# Altium schematic symbol library Analog Devices Operational Amplifiers.SchLib: 2102 symbols (part 4 of 35) (continued)
## AD824AR-14-REEL7
designator U?
Quad Channel Rail-to-Rail Operational Amplifier, 2 MHz BW, 2 V/us SR, Industrial, 14-pin SOIC (R-14), Reel; Generic Part Number: AD824; Manufacturer: Analog Devices; PartNumber: AD824AR-14-REEL7; Amplifiers Per Package: 4; Input Bias Current: 4pA; Input Offset Voltage: 500uV; Iq/Amp: 625uA; Slew Rate: 2V/us; Small Signal Bandwidth: 2MHz; V Span Max: 36V; V Span Min: 3V; DatasheetVersion: Rev. C; PackageVersion: 060606-A; PackageReference: R-14; PackageDescription: 14-Pin Standard Small Outline Package, Body 8.65 x 3.9 mm, Pitch 1.27 mm; Supplier 1: Digi-Key; Supplier Part Number 1: AD824AR-14-REEL7-ND; Supplier 2: Newark; Supplier Part Number 2: 88H0201; Mounting Technology: Surface Mount; Code_JEDEC: MS-012-AB; ComponentLink1Description: Manufacturer URL; ComponentLink1URL: http://www.analog.com/en/index.html; ComponentLink2Description: Datasheet; ComponentLink2URL: http://www.analog.com/static/imported-files/data_sheets/AD824.pdf; ComponentLink3Description: Package Specification; ComponentLink3URL: http://www.analog.com/static/imported-files/packages/PKG_PDF/SOIC_Narrow%20(R)/R_14.pdf
footprint ADI-R-14_N (SOIC, 14-Leads, Body 8.65x3.9mm, Pitch 1.27mm, IPC Medium Density)
footprint ADI-R-14_L (SOIC, 14-Leads, Body 8.65x3.9mm, Pitch 1.27mm, IPC High Density)
footprint ADI-R-14_M (SOIC, 14-Leads, Body 8.65x3.9mm, Pitch 1.27mm, IPC Low Density)
pins on every part: 4 +V (power), 11 -V (power)
part A pins: 1 OUT A (out), 2 -IN A (in), 3 +IN A (in)
part B pins: 5 +IN B (in), 6 -IN B (in), 7 OUT B (out)
part C pins: 8 OUT C (out), 9 -IN C (in), 10 +IN C (in)
part D pins: 12 +IN D (in), 13 -IN D (in), 14 OUT D (out)

## AD824ARZ-14
designator U?
Quad Channel Rail-to-Rail Operational Amplifier, 2 MHz BW, 2 V/us SR, Industrial, 14-pin SOIC (R-14), Tube; Generic Part Number: AD824; Manufacturer: Analog Devices; PartNumber: AD824ARZ-14; Amplifiers Per Package: 4; Input Bias Current: 4pA; Input Offset Voltage: 500uV; Iq/Amp: 625uA; Slew Rate: 2V/us; Small Signal Bandwidth: 2MHz; V Span Max: 36V; V Span Min: 3V; DatasheetVersion: Rev. C; PackageVersion: 060606-A; PackageReference: R-14; PackageDescription: 14-Pin Standard Small Outline Package, Body 8.65 x 3.9 mm, Pitch 1.27 mm; Supplier 1: Digi-Key; Supplier Part Number 1: AD824ARZ-14-ND; Supplier 2: Farnell; Supplier Part Number 2: 9425535; Supplier 3: Newark; Supplier Part Number 3: 88H0202; Mounting Technology: Surface Mount; Code_JEDEC: MS-012-AB; ComponentLink1Description: Manufacturer URL; ComponentLink1URL: http://www.analog.com/en/index.html; ComponentLink2Description: Datasheet; ComponentLink2URL: http://www.analog.com/static/imported-files/data_sheets/AD824.pdf; ComponentLink3Description: Package Specification; ComponentLink3URL: http://www.analog.com/static/imported-files/packages/PKG_PDF/SOIC_Narrow%20(R)/R_14.pdf
footprint ADI-R-14_N (SOIC, 14-Leads, Body 8.65x3.9mm, Pitch 1.27mm, IPC Medium Density)
footprint ADI-R-14_L (SOIC, 14-Leads, Body 8.65x3.9mm, Pitch 1.27mm, IPC High Density)
footprint ADI-R-14_M (SOIC, 14-Leads, Body 8.65x3.9mm, Pitch 1.27mm, IPC Low Density)
pins on every part: 4 +V (power), 11 -V (power)
part A pins: 1 OUT A (out), 2 -IN A (in), 3 +IN A (in)
part B pins: 5 +IN B (in), 6 -IN B (in), 7 OUT B (out)
part C pins: 8 OUT C (out), 9 -IN C (in), 10 +IN C (in)
part D pins: 12 +IN D (in), 13 -IN D (in), 14 OUT D (out)

## AD824ARZ-14-3V
designator U?
Quad Channel Rail-to-Rail Operational Amplifier, 2 MHz BW, 2 V/us SR, Industrial, 14-pin SOIC (R-14), Tube; Generic Part Number: AD824; Manufacturer: Analog Devices; PartNumber: AD824ARZ-14-3V; Amplifiers Per Package: 4; Input Bias Current: 4pA; Input Offset Voltage: 500uV; Iq/Amp: 625uA; Slew Rate: 2V/us; Small Signal Bandwidth: 2MHz; V Span Max: 36V; V Span Min: 3V; DatasheetVersion: Rev. C; PackageVersion: 060606-A; PackageReference: R-14; PackageDescription: 14-Pin Standard Small Outline Package, Body 8.65 x 3.9 mm, Pitch 1.27 mm; Supplier 1: Digi-Key; Supplier Part Number 1: AD824ARZ-14-3V-ND; Mounting Technology: Surface Mount; Code_JEDEC: MS-012-AB; ComponentLink1Description: Manufacturer URL; ComponentLink1URL: http://www.analog.com/en/index.html; ComponentLink2Description: Datasheet; ComponentLink2URL: http://www.analog.com/static/imported-files/data_sheets/AD824.pdf; ComponentLink3Description: Package Specification; ComponentLink3URL: http://www.analog.com/static/imported-files/packages/PKG_PDF/SOIC_Narrow%20(R)/R_14.pdf
footprint ADI-R-14_N (SOIC, 14-Leads, Body 8.65x3.9mm, Pitch 1.27mm, IPC Medium Density)
footprint ADI-R-14_L (SOIC, 14-Leads, Body 8.65x3.9mm, Pitch 1.27mm, IPC High Density)
footprint ADI-R-14_M (SOIC, 14-Leads, Body 8.65x3.9mm, Pitch 1.27mm, IPC Low Density)
pins on every part: 4 +V (power), 11 -V (power)
part A pins: 1 OUT A (out), 2 -IN A (in), 3 +IN A (in)
part B pins: 5 +IN B (in), 6 -IN B (in), 7 OUT B (out)
part C pins: 8 OUT C (out), 9 -IN C (in), 10 +IN C (in)
part D pins: 12 +IN D (in), 13 -IN D (in), 14 OUT D (out)

## AD824ARZ-14-3V-RL
designator U?
Quad Channel Rail-to-Rail Operational Amplifier, 2 MHz BW, 2 V/us SR, Industrial, 14-pin SOIC (R-14), Reel; Generic Part Number: AD824; Manufacturer: Analog Devices; PartNumber: AD824ARZ-14-3V-RL; Amplifiers Per Package: 4; Input Bias Current: 4pA; Input Offset Voltage: 500uV; Iq/Amp: 625uA; Slew Rate: 2V/us; Small Signal Bandwidth: 2MHz; V Span Max: 36V; V Span Min: 3V; DatasheetVersion: Rev. C; PackageVersion: 060606-A; PackageReference: R-14; PackageDescription: 14-Pin Standard Small Outline Package, Body 8.65 x 3.9 mm, Pitch 1.27 mm; Supplier 1: Digi-Key; Supplier Part Number 1: AD824ARZ-14-3V-RL-ND; Mounting Technology: Surface Mount; Code_JEDEC: MS-012-AB; ComponentLink1Description: Manufacturer URL; ComponentLink1URL: http://www.analog.com/en/index.html; ComponentLink2Description: Datasheet; ComponentLink2URL: http://www.analog.com/static/imported-files/data_sheets/AD824.pdf; ComponentLink3Description: Package Specification; ComponentLink3URL: http://www.analog.com/static/imported-files/packages/PKG_PDF/SOIC_Narrow%20(R)/R_14.pdf
footprint ADI-R-14_N (SOIC, 14-Leads, Body 8.65x3.9mm, Pitch 1.27mm, IPC Medium Density)
footprint ADI-R-14_L (SOIC, 14-Leads, Body 8.65x3.9mm, Pitch 1.27mm, IPC High Density)
footprint ADI-R-14_M (SOIC, 14-Leads, Body 8.65x3.9mm, Pitch 1.27mm, IPC Low Density)
pins on every part: 4 +V (power), 11 -V (power)
part A pins: 1 OUT A (out), 2 -IN A (in), 3 +IN A (in)
part B pins: 5 +IN B (in), 6 -IN B (in), 7 OUT B (out)
part C pins: 8 OUT C (out), 9 -IN C (in), 10 +IN C (in)
part D pins: 12 +IN D (in), 13 -IN D (in), 14 OUT D (out)

## AD824ARZ-14-REEL
designator U?
Quad Channel Rail-to-Rail Operational Amplifier, 2 MHz BW, 2 V/us SR, Industrial, 14-pin SOIC (R-14), Reel; Generic Part Number: AD824; Manufacturer: Analog Devices; PartNumber: AD824ARZ-14-REEL; Amplifiers Per Package: 4; Input Bias Current: 4pA; Input Offset Voltage: 500uV; Iq/Amp: 625uA; Slew Rate: 2V/us; Small Signal Bandwidth: 2MHz; V Span Max: 36V; V Span Min: 3V; DatasheetVersion: Rev. C; PackageVersion: 060606-A; PackageReference: R-14; PackageDescription: 14-Pin Standard Small Outline Package, Body 8.65 x 3.9 mm, Pitch 1.27 mm; Supplier 1: Digi-Key; Supplier Part Number 1: AD824ARZ-14-REEL-ND; Supplier 2: Newark; Supplier Part Number 2: 88H0203; Mounting Technology: Surface Mount; Code_JEDEC: MS-012-AB; ComponentLink1Description: Manufacturer URL; ComponentLink1URL: http://www.analog.com/en/index.html; ComponentLink2Description: Datasheet; ComponentLink2URL: http://www.analog.com/static/imported-files/data_sheets/AD824.pdf; ComponentLink3Description: Package Specification; ComponentLink3URL: http://www.analog.com/static/imported-files/packages/PKG_PDF/SOIC_Narrow%20(R)/R_14.pdf
footprint ADI-R-14_N (SOIC, 14-Leads, Body 8.65x3.9mm, Pitch 1.27mm, IPC Medium Density)
footprint ADI-R-14_L (SOIC, 14-Leads, Body 8.65x3.9mm, Pitch 1.27mm, IPC High Density)
footprint ADI-R-14_M (SOIC, 14-Leads, Body 8.65x3.9mm, Pitch 1.27mm, IPC Low Density)
pins on every part: 4 +V (power), 11 -V (power)
part A pins: 1 OUT A (out), 2 -IN A (in), 3 +IN A (in)
part B pins: 5 +IN B (in), 6 -IN B (in), 7 OUT B (out)
part C pins: 8 OUT C (out), 9 -IN C (in), 10 +IN C (in)
part D pins: 12 +IN D (in), 13 -IN D (in), 14 OUT D (out)

## AD824ARZ-14-REEL7
designator U?
Quad Channel Rail-to-Rail Operational Amplifier, 2 MHz BW, 2 V/us SR, Industrial, 14-pin SOIC (R-14), Reel; Generic Part Number: AD824; Manufacturer: Analog Devices; PartNumber: AD824ARZ-14-REEL7; Amplifiers Per Package: 4; Input Bias Current: 4pA; Input Offset Voltage: 500uV; Iq/Amp: 625uA; Slew Rate: 2V/us; Small Signal Bandwidth: 2MHz; V Span Max: 36V; V Span Min: 3V; DatasheetVersion: Rev. C; PackageVersion: 060606-A; PackageReference: R-14; PackageDescription: 14-Pin Standard Small Outline Package, Body 8.65 x 3.9 mm, Pitch 1.27 mm; Supplier 1: Digi-Key; Supplier Part Number 1: AD824ARZ-14-REEL7-ND; Supplier 2: Newark; Supplier Part Number 2: 59K6519; Mounting Technology: Surface Mount; Code_JEDEC: MS-012-AB; ComponentLink1Description: Manufacturer URL; ComponentLink1URL: http://www.analog.com/en/index.html; ComponentLink2Description: Datasheet; ComponentLink2URL: http://www.analog.com/static/imported-files/data_sheets/AD824.pdf; ComponentLink3Description: Package Specification; ComponentLink3URL: http://www.analog.com/static/imported-files/packages/PKG_PDF/SOIC_Narrow%20(R)/R_14.pdf
footprint ADI-R-14_N (SOIC, 14-Leads, Body 8.65x3.9mm, Pitch 1.27mm, IPC Medium Density)
footprint ADI-R-14_L (SOIC, 14-Leads, Body 8.65x3.9mm, Pitch 1.27mm, IPC High Density)
footprint ADI-R-14_M (SOIC, 14-Leads, Body 8.65x3.9mm, Pitch 1.27mm, IPC Low Density)
pins on every part: 4 +V (power), 11 -V (power)
part A pins: 1 OUT A (out), 2 -IN A (in), 3 +IN A (in)
part B pins: 5 +IN B (in), 6 -IN B (in), 7 OUT B (out)
part C pins: 8 OUT C (out), 9 -IN C (in), 10 +IN C (in)
part D pins: 12 +IN D (in), 13 -IN D (in), 14 OUT D (out)

## AD825AR
designator U?
Single Channel Low Distortion Operational Amplifier, 46 MHz BW, 140 V/us SR, Industrial, 8-pin SOIC (R-8), Tube; Generic Part Number: AD825; Manufacturer: Analog Devices; PartNumber: AD825AR; Amplifiers Per Package: 1; Input Bias Current: 10pA; Input Offset Voltage: 1mV; Iq/Amp: 7.2mA; Small Signal Bandwidth: 46MHz; V Span Max: 36V; V Span Min: 10V; DatasheetVersion: Rev. F; PackageVersion: 060506-A; PackageReference: R-8; PackageDescription: 8-Pin Standard Small Outline Package, Body 3.9 x 4.9 mm, Pitch 1.27 mm; Supplier 1: Digi-Key; Supplier Part Number 1: AD825AR-ND; Packing: Tube; Slew Rate: 140V/us; Mounting Technology: Surface Mount; Code_JEDEC: MS-012-AA; ComponentLink1Description: Manufacturer URL; ComponentLink1URL: http://www.analog.com/en/index.html; ComponentLink2Description: Datasheet; ComponentLink2URL: http://www.analog.com/static/imported-files/data_sheets/AD825.pdf; ComponentLink3Description: Package Specification; ComponentLink3URL: http://www.analog.com/static/imported-files/packages/PKG_PDF/SOIC_Narrow%20(R)/R_8.pdf
footprint ADI-R-8_N (SOIC, 8-Leads, Body 4.9x3.9mm, Pitch 1.27mm, IPC Medium Density)
footprint ADI-R-8_L (SOIC, 8-Leads, Body 4.9x3.9mm, Pitch 1.27mm, IPC High Density)
footprint ADI-R-8_M (SOIC, 8-Leads, Body 4.9x3.9mm, Pitch 1.27mm, IPC Low Density)
part A pins: 2 -IN (in), 3 +IN (in), 4 -VS (power), 6 OUT (out), 7 +VS (power)
part B pins: 1 NC, 5 NC, 8 NC

## AD825AR-16-REEL
designator U?
Single Channel Low Distortion Operational Amplifier, 46 MHz BW, 140 V/us SR, Industrial, 16-pin SOIC (RW-16), Reel; Generic Part Number: AD825; Manufacturer: Analog Devices; PartNumber: AD825AR-16-REEL; Amplifiers Per Package: 1; Input Bias Current: 10pA; Input Offset Voltage: 1mV; Iq/Amp: 7.2mA; Small Signal Bandwidth: 46MHz; V Span Max: 36V; V Span Min: 10V; DatasheetVersion: Rev. F; PackageVersion: 032707-B; PackageReference: RW-16; PackageDescription: 16-Pin Standard Small Outline Package, Body 10.3 x 7.5 mm, Pitch 1.27 mm; Supplier 1: Digi-Key; Supplier Part Number 1: AD825AR-16-REEL-ND; Packing: Reel; Slew Rate: 140V/us; Mounting Technology: Surface Mount; Code_JEDEC: MS-013-AA; ComponentLink1Description: Manufacturer URL; ComponentLink1URL: http://www.analog.com/en/index.html; ComponentLink2Description: Datasheet; ComponentLink2URL: http://www.analog.com/static/imported-files/data_sheets/AD825.pdf; ComponentLink3Description: Package Specification; ComponentLink3URL: http://www.analog.com/static/imported-files/packages/PKG_PDF/SOIC_WIDE%20%28RW%29/RW_16.pdf
footprint ADI-RW-16_N (SOIC, 16-Leads, Body 10.3x7.5mm, Pitch 1.27mm,IPC Medium Density)
footprint ADI-RW-16_L (SOIC, 16-Leads, Body 10.3x7.5mm, Pitch 1.27mm, IPC High Density)
footprint ADI-RW-16_M (SOIC, 16-Leads, Body 10.3x7.5mm, Pitch 1.27mm, IPC Low Density)
part A pins: 4 -IN (in), 5 +IN (in), 6 -VS (power), 12 OUT (out), 13 +VS (power)
part B pins: 1 NC, 2 NC, 3 NC, 7 NC, 8 NC, 9 NC, 10 NC, 11 NC, 14 NC, 15 NC, 16 NC

## AD825AR-16-REEL7
designator U?
Single Channel Low Distortion Operational Amplifier, 46 MHz BW, 140 V/us SR, Industrial, 16-pin SOIC (RW-16), Reel; Generic Part Number: AD825; Manufacturer: Analog Devices; PartNumber: AD825AR-16-REEL7; Amplifiers Per Package: 1; Input Bias Current: 10pA; Input Offset Voltage: 1mV; Iq/Amp: 7.2mA; Small Signal Bandwidth: 46MHz; V Span Max: 36V; V Span Min: 10V; DatasheetVersion: Rev. F; PackageVersion: 032707-B; PackageReference: RW-16; PackageDescription: 16-Pin Standard Small Outline Package, Body 10.3 x 7.5 mm, Pitch 1.27 mm; Supplier 1: Digi-Key; Supplier Part Number 1: AD825AR-16-REEL7-ND; Packing: Reel; Slew Rate: 140V/us; Mounting Technology: Surface Mount; Code_JEDEC: MS-013-AA; ComponentLink1Description: Manufacturer URL; ComponentLink1URL: http://www.analog.com/en/index.html; ComponentLink2Description: Datasheet; ComponentLink2URL: http://www.analog.com/static/imported-files/data_sheets/AD825.pdf; ComponentLink3Description: Package Specification; ComponentLink3URL: http://www.analog.com/static/imported-files/packages/PKG_PDF/SOIC_WIDE%20%28RW%29/RW_16.pdf
footprint ADI-RW-16_N (SOIC, 16-Leads, Body 10.3x7.5mm, Pitch 1.27mm,IPC Medium Density)
footprint ADI-RW-16_L (SOIC, 16-Leads, Body 10.3x7.5mm, Pitch 1.27mm, IPC High Density)
footprint ADI-RW-16_M (SOIC, 16-Leads, Body 10.3x7.5mm, Pitch 1.27mm, IPC Low Density)
part A pins: 4 -IN (in), 5 +IN (in), 6 -VS (power), 12 OUT (out), 13 +VS (power)
part B pins: 1 NC, 2 NC, 3 NC, 7 NC, 8 NC, 9 NC, 10 NC, 11 NC, 14 NC, 15 NC, 16 NC

## AD825AR-REEL
designator U?
Single Channel Low Distortion Operational Amplifier, 46 MHz BW, 140 V/us SR, Industrial, 8-pin SOIC (R-8), Reel; Generic Part Number: AD825; Manufacturer: Analog Devices; PartNumber: AD825AR-REEL; Amplifiers Per Package: 1; Input Bias Current: 10pA; Input Offset Voltage: 1mV; Iq/Amp: 7.2mA; Small Signal Bandwidth: 46MHz; V Span Max: 36V; V Span Min: 10V; DatasheetVersion: Rev. F; PackageVersion: 060506-A; PackageReference: R-8; PackageDescription: 8-Pin Standard Small Outline Package, Body 3.9 x 4.9 mm, Pitch 1.27 mm; Supplier 1: Digi-Key; Supplier Part Number 1: AD825AR-REEL-ND; Supplier 2: Newark; Supplier Part Number 2: 09B6518; Packing: Reel; Slew Rate: 140V/us; Mounting Technology: Surface Mount; Code_JEDEC: MS-012-AA; ComponentLink1Description: Manufacturer URL; ComponentLink1URL: http://www.analog.com/en/index.html; ComponentLink2Description: Datasheet; ComponentLink2URL: http://www.analog.com/static/imported-files/data_sheets/AD825.pdf; ComponentLink3Description: Package Specification; ComponentLink3URL: http://www.analog.com/static/imported-files/packages/PKG_PDF/SOIC_Narrow%20(R)/R_8.pdf
footprint ADI-R-8_N (SOIC, 8-Leads, Body 4.9x3.9mm, Pitch 1.27mm, IPC Medium Density)
footprint ADI-R-8_L (SOIC, 8-Leads, Body 4.9x3.9mm, Pitch 1.27mm, IPC High Density)
footprint ADI-R-8_M (SOIC, 8-Leads, Body 4.9x3.9mm, Pitch 1.27mm, IPC Low Density)
part A pins: 2 -IN (in), 3 +IN (in), 4 -VS (power), 6 OUT (out), 7 +VS (power)
part B pins: 1 NC, 5 NC, 8 NC

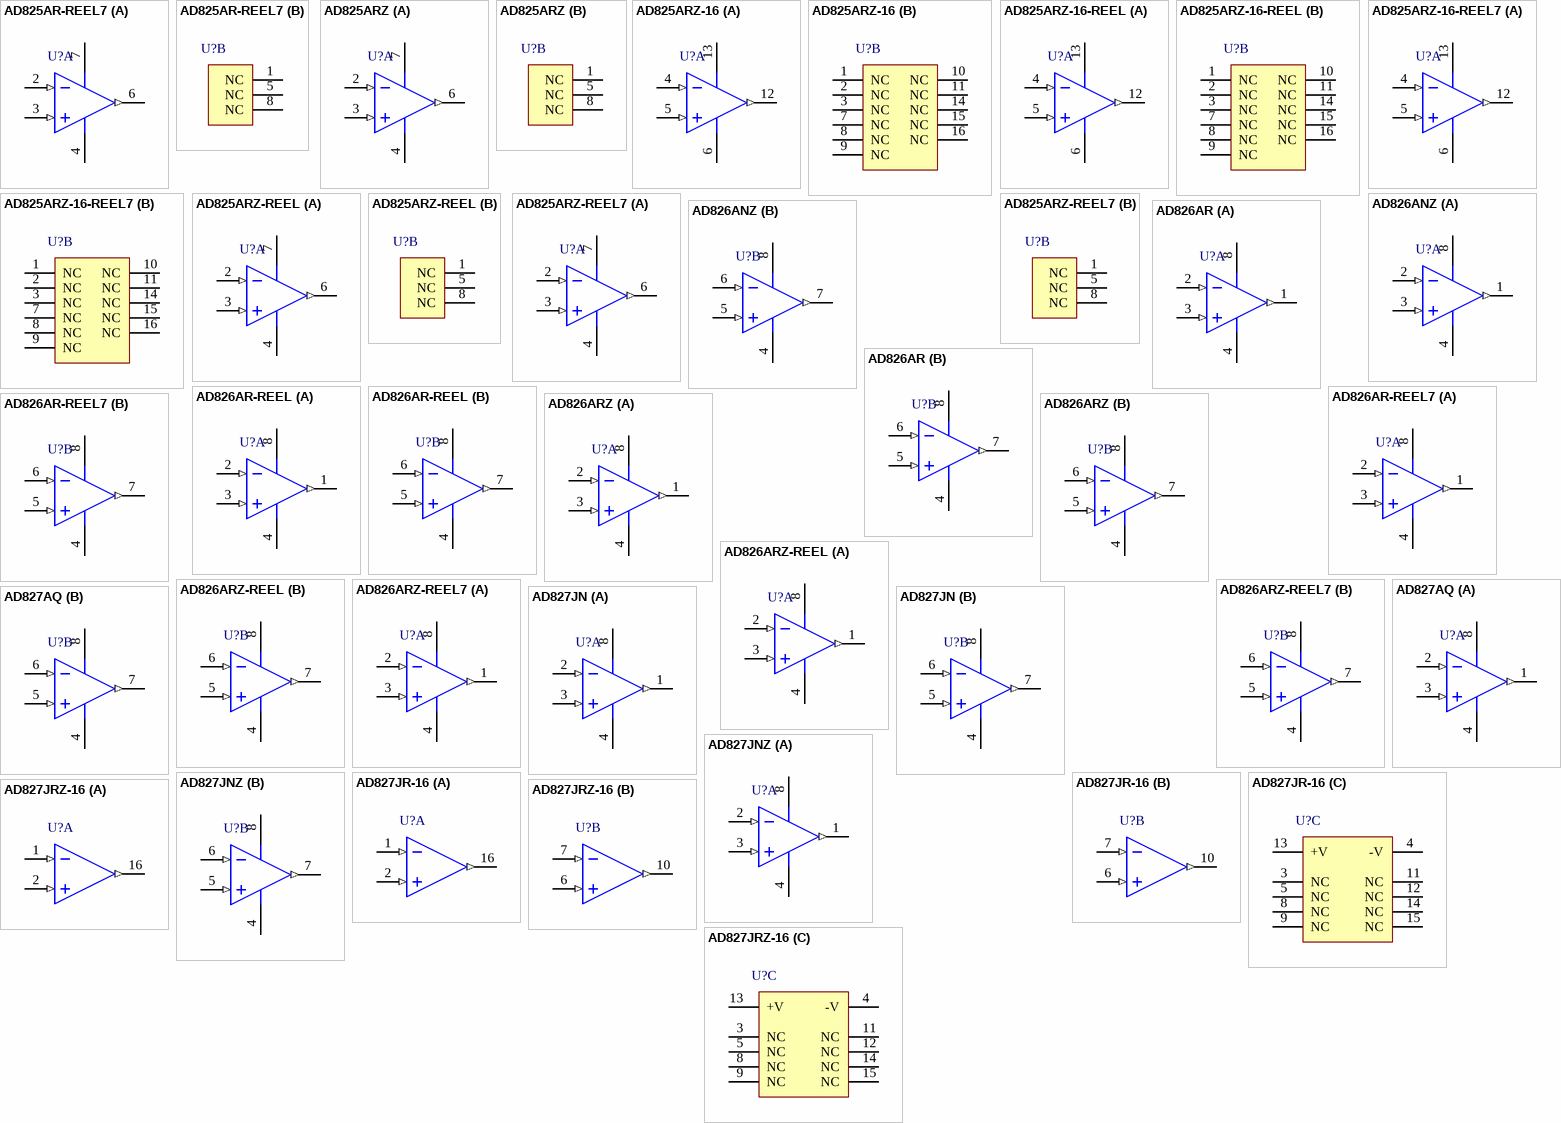
[diagram p12: symbols AD825AR-REEL7 to AD827JRZ-16]

## AD825AR-REEL7
designator U?
Single Channel Low Distortion Operational Amplifier, 46 MHz BW, 140 V/us SR, Industrial, 8-pin SOIC (R-8), Reel; Generic Part Number: AD825; Manufacturer: Analog Devices; PartNumber: AD825AR-REEL7; Amplifiers Per Package: 1; Input Bias Current: 10pA; Input Offset Voltage: 1mV; Iq/Amp: 7.2mA; Small Signal Bandwidth: 46MHz; V Span Max: 36V; V Span Min: 10V; DatasheetVersion: Rev. F; PackageVersion: 060506-A; PackageReference: R-8; PackageDescription: 8-Pin Standard Small Outline Package, Body 3.9 x 4.9 mm, Pitch 1.27 mm; Supplier 1: Digi-Key; Supplier Part Number 1: AD825AR-REEL7-ND; Supplier 2: Newark; Supplier Part Number 2: 09B6519; Packing: Reel; Slew Rate: 140V/us; Mounting Technology: Surface Mount; Code_JEDEC: MS-012-AA; ComponentLink1Description: Manufacturer URL; ComponentLink1URL: http://www.analog.com/en/index.html; ComponentLink2Description: Datasheet; ComponentLink2URL: http://www.analog.com/static/imported-files/data_sheets/AD825.pdf; ComponentLink3Description: Package Specification; ComponentLink3URL: http://www.analog.com/static/imported-files/packages/PKG_PDF/SOIC_Narrow%20(R)/R_8.pdf
footprint ADI-R-8_N (SOIC, 8-Leads, Body 4.9x3.9mm, Pitch 1.27mm, IPC Medium Density)
footprint ADI-R-8_L (SOIC, 8-Leads, Body 4.9x3.9mm, Pitch 1.27mm, IPC High Density)
footprint ADI-R-8_M (SOIC, 8-Leads, Body 4.9x3.9mm, Pitch 1.27mm, IPC Low Density)
part A pins: 2 -IN (in), 3 +IN (in), 4 -VS (power), 6 OUT (out), 7 +VS (power)
part B pins: 1 NC, 5 NC, 8 NC

## AD825ARZ
designator U?
Single Channel Low Distortion Operational Amplifier, 46 MHz BW, 140 V/us SR, Industrial, 8-pin SOIC (R-8), Tube; Generic Part Number: AD825; Manufacturer: Analog Devices; PartNumber: AD825ARZ; Amplifiers Per Package: 1; Input Bias Current: 10pA; Input Offset Voltage: 1mV; Iq/Amp: 7.2mA; Small Signal Bandwidth: 46MHz; V Span Max: 36V; V Span Min: 10V; DatasheetVersion: Rev. F; PackageVersion: 060506-A; PackageReference: R-8; PackageDescription: 8-Pin Standard Small Outline Package, Body 3.9 x 4.9 mm, Pitch 1.27 mm; Supplier 1: Digi-Key; Supplier Part Number 1: AD825ARZ-ND; Supplier 2: Farnell; Supplier Part Number 2: 9603735; Supplier 3: Newark; Supplier Part Number 3: 59K6528; Packing: Tube; Slew Rate: 140V/us; Mounting Technology: Surface Mount; Code_JEDEC: MS-012-AA; ComponentLink1Description: Manufacturer URL; ComponentLink1URL: http://www.analog.com/en/index.html; ComponentLink2Description: Datasheet; ComponentLink2URL: http://www.analog.com/static/imported-files/data_sheets/AD825.pdf; ComponentLink3Description: Package Specification; ComponentLink3URL: http://www.analog.com/static/imported-files/packages/PKG_PDF/SOIC_Narrow%20(R)/R_8.pdf
footprint ADI-R-8_N (SOIC, 8-Leads, Body 4.9x3.9mm, Pitch 1.27mm, IPC Medium Density)
footprint ADI-R-8_L (SOIC, 8-Leads, Body 4.9x3.9mm, Pitch 1.27mm, IPC High Density)
footprint ADI-R-8_M (SOIC, 8-Leads, Body 4.9x3.9mm, Pitch 1.27mm, IPC Low Density)
part A pins: 2 -IN (in), 3 +IN (in), 4 -VS (power), 6 OUT (out), 7 +VS (power)
part B pins: 1 NC, 5 NC, 8 NC

## AD825ARZ-16
designator U?
Single Channel Low Distortion Operational Amplifier, 46 MHz BW, 140 V/us SR, Industrial, 16-pin SOIC (RW-16), Tube; Generic Part Number: AD825; Manufacturer: Analog Devices; PartNumber: AD825ARZ-16; Amplifiers Per Package: 1; Input Bias Current: 10pA; Input Offset Voltage: 1mV; Iq/Amp: 7.2mA; Small Signal Bandwidth: 46MHz; V Span Max: 36V; V Span Min: 10V; DatasheetVersion: Rev. F; PackageVersion: 032707-B; PackageReference: RW-16; PackageDescription: 16-Pin Standard Small Outline Package, Body 10.3 x 7.5 mm, Pitch 1.27 mm; Supplier 1: Digi-Key; Supplier Part Number 1: AD825ARZ-16-ND; Packing: Tube; Slew Rate: 140V/us; Mounting Technology: Surface Mount; Code_JEDEC: MS-013-AA; ComponentLink1Description: Manufacturer URL; ComponentLink1URL: http://www.analog.com/en/index.html; ComponentLink2Description: Datasheet; ComponentLink2URL: http://www.analog.com/static/imported-files/data_sheets/AD825.pdf; ComponentLink3Description: Package Specification; ComponentLink3URL: http://www.analog.com/static/imported-files/packages/PKG_PDF/SOIC_WIDE%20%28RW%29/RW_16.pdf
footprint ADI-RW-16_N (SOIC, 16-Leads, Body 10.3x7.5mm, Pitch 1.27mm,IPC Medium Density)
footprint ADI-RW-16_L (SOIC, 16-Leads, Body 10.3x7.5mm, Pitch 1.27mm, IPC High Density)
footprint ADI-RW-16_M (SOIC, 16-Leads, Body 10.3x7.5mm, Pitch 1.27mm, IPC Low Density)
part A pins: 4 -IN (in), 5 +IN (in), 6 -VS (power), 12 OUT (out), 13 +VS (power)
part B pins: 1 NC, 2 NC, 3 NC, 7 NC, 8 NC, 9 NC, 10 NC, 11 NC, 14 NC, 15 NC, 16 NC

## AD825ARZ-16-REEL
designator U?
Single Channel Low Distortion Operational Amplifier, 46 MHz BW, 140 V/us SR, Industrial, 16-pin SOIC (RW-16), Reel; Generic Part Number: AD825; Manufacturer: Analog Devices; PartNumber: AD825ARZ-16-REEL; Amplifiers Per Package: 1; Input Bias Current: 10pA; Input Offset Voltage: 1mV; Iq/Amp: 7.2mA; Small Signal Bandwidth: 46MHz; V Span Max: 36V; V Span Min: 10V; DatasheetVersion: Rev. F; PackageVersion: 032707-B; PackageReference: RW-16; PackageDescription: 16-Pin Standard Small Outline Package, Body 10.3 x 7.5 mm, Pitch 1.27 mm; Supplier 1: Digi-Key; Supplier Part Number 1: AD825ARZ-16-REEL-ND; Packing: Reel; Slew Rate: 140V/us; Mounting Technology: Surface Mount; Code_JEDEC: MS-013-AA; ComponentLink1Description: Manufacturer URL; ComponentLink1URL: http://www.analog.com/en/index.html; ComponentLink2Description: Datasheet; ComponentLink2URL: http://www.analog.com/static/imported-files/data_sheets/AD825.pdf; ComponentLink3Description: Package Specification; ComponentLink3URL: http://www.analog.com/static/imported-files/packages/PKG_PDF/SOIC_WIDE%20%28RW%29/RW_16.pdf
footprint ADI-RW-16_N (SOIC, 16-Leads, Body 10.3x7.5mm, Pitch 1.27mm,IPC Medium Density)
footprint ADI-RW-16_L (SOIC, 16-Leads, Body 10.3x7.5mm, Pitch 1.27mm, IPC High Density)
footprint ADI-RW-16_M (SOIC, 16-Leads, Body 10.3x7.5mm, Pitch 1.27mm, IPC Low Density)
part A pins: 4 -IN (in), 5 +IN (in), 6 -VS (power), 12 OUT (out), 13 +VS (power)
part B pins: 1 NC, 2 NC, 3 NC, 7 NC, 8 NC, 9 NC, 10 NC, 11 NC, 14 NC, 15 NC, 16 NC

## AD825ARZ-16-REEL7
designator U?
Single Channel Low Distortion Operational Amplifier, 46 MHz BW, 140 V/us SR, Industrial, 16-pin SOIC (RW-16), Reel; Generic Part Number: AD825; Manufacturer: Analog Devices; PartNumber: AD825ARZ-16-REEL7; Amplifiers Per Package: 1; Input Bias Current: 10pA; Input Offset Voltage: 1mV; Iq/Amp: 7.2mA; Small Signal Bandwidth: 46MHz; V Span Max: 36V; V Span Min: 10V; DatasheetVersion: Rev. F; PackageVersion: 032707-B; PackageReference: RW-16; PackageDescription: 16-Pin Standard Small Outline Package, Body 10.3 x 7.5 mm, Pitch 1.27 mm; Supplier 1: Digi-Key; Supplier Part Number 1: AD825ARZ-16-REEL7-ND; Packing: Reel; Slew Rate: 140V/us; Mounting Technology: Surface Mount; Code_JEDEC: MS-013-AA; ComponentLink1Description: Manufacturer URL; ComponentLink1URL: http://www.analog.com/en/index.html; ComponentLink2Description: Datasheet; ComponentLink2URL: http://www.analog.com/static/imported-files/data_sheets/AD825.pdf; ComponentLink3Description: Package Specification; ComponentLink3URL: http://www.analog.com/static/imported-files/packages/PKG_PDF/SOIC_WIDE%20%28RW%29/RW_16.pdf
footprint ADI-RW-16_N (SOIC, 16-Leads, Body 10.3x7.5mm, Pitch 1.27mm,IPC Medium Density)
footprint ADI-RW-16_L (SOIC, 16-Leads, Body 10.3x7.5mm, Pitch 1.27mm, IPC High Density)
footprint ADI-RW-16_M (SOIC, 16-Leads, Body 10.3x7.5mm, Pitch 1.27mm, IPC Low Density)
part A pins: 4 -IN (in), 5 +IN (in), 6 -VS (power), 12 OUT (out), 13 +VS (power)
part B pins: 1 NC, 2 NC, 3 NC, 7 NC, 8 NC, 9 NC, 10 NC, 11 NC, 14 NC, 15 NC, 16 NC

## AD825ARZ-REEL
designator U?
Single Channel Low Distortion Operational Amplifier, 46 MHz BW, 140 V/us SR, Industrial, 8-pin SOIC (R-8), Reel; Generic Part Number: AD825; Manufacturer: Analog Devices; PartNumber: AD825ARZ-REEL; Amplifiers Per Package: 1; Input Bias Current: 10pA; Input Offset Voltage: 1mV; Iq/Amp: 7.2mA; Small Signal Bandwidth: 46MHz; V Span Max: 36V; V Span Min: 10V; DatasheetVersion: Rev. F; PackageVersion: 060506-A; PackageReference: R-8; PackageDescription: 8-Pin Standard Small Outline Package, Body 3.9 x 4.9 mm, Pitch 1.27 mm; Supplier 1: Digi-Key; Supplier Part Number 1: AD825ARZ-REEL-ND; Packing: Reel; Slew Rate: 140V/us; Mounting Technology: Surface Mount; Code_JEDEC: MS-012-AA; ComponentLink1Description: Manufacturer URL; ComponentLink1URL: http://www.analog.com/en/index.html; ComponentLink2Description: Datasheet; ComponentLink2URL: http://www.analog.com/static/imported-files/data_sheets/AD825.pdf; ComponentLink3Description: Package Specification; ComponentLink3URL: http://www.analog.com/static/imported-files/packages/PKG_PDF/SOIC_Narrow%20(R)/R_8.pdf
footprint ADI-R-8_N (SOIC, 8-Leads, Body 4.9x3.9mm, Pitch 1.27mm, IPC Medium Density)
footprint ADI-R-8_L (SOIC, 8-Leads, Body 4.9x3.9mm, Pitch 1.27mm, IPC High Density)
footprint ADI-R-8_M (SOIC, 8-Leads, Body 4.9x3.9mm, Pitch 1.27mm, IPC Low Density)
part A pins: 2 -IN (in), 3 +IN (in), 4 -VS (power), 6 OUT (out), 7 +VS (power)
part B pins: 1 NC, 5 NC, 8 NC
